# Altium footprint library Receiver_Library.PcbLib: 29 footprints (part 1 of 2)
Each footprint in its own frame and in the unit in brackets; x right, y up, seen from the top. Pads: shape width x height; smd on the part's side, far side on the other; paste and mask are expansions set on the pad; w line width, h text height; cw(c..) or ccw(c..) is an arc to the next point about the centre after c.
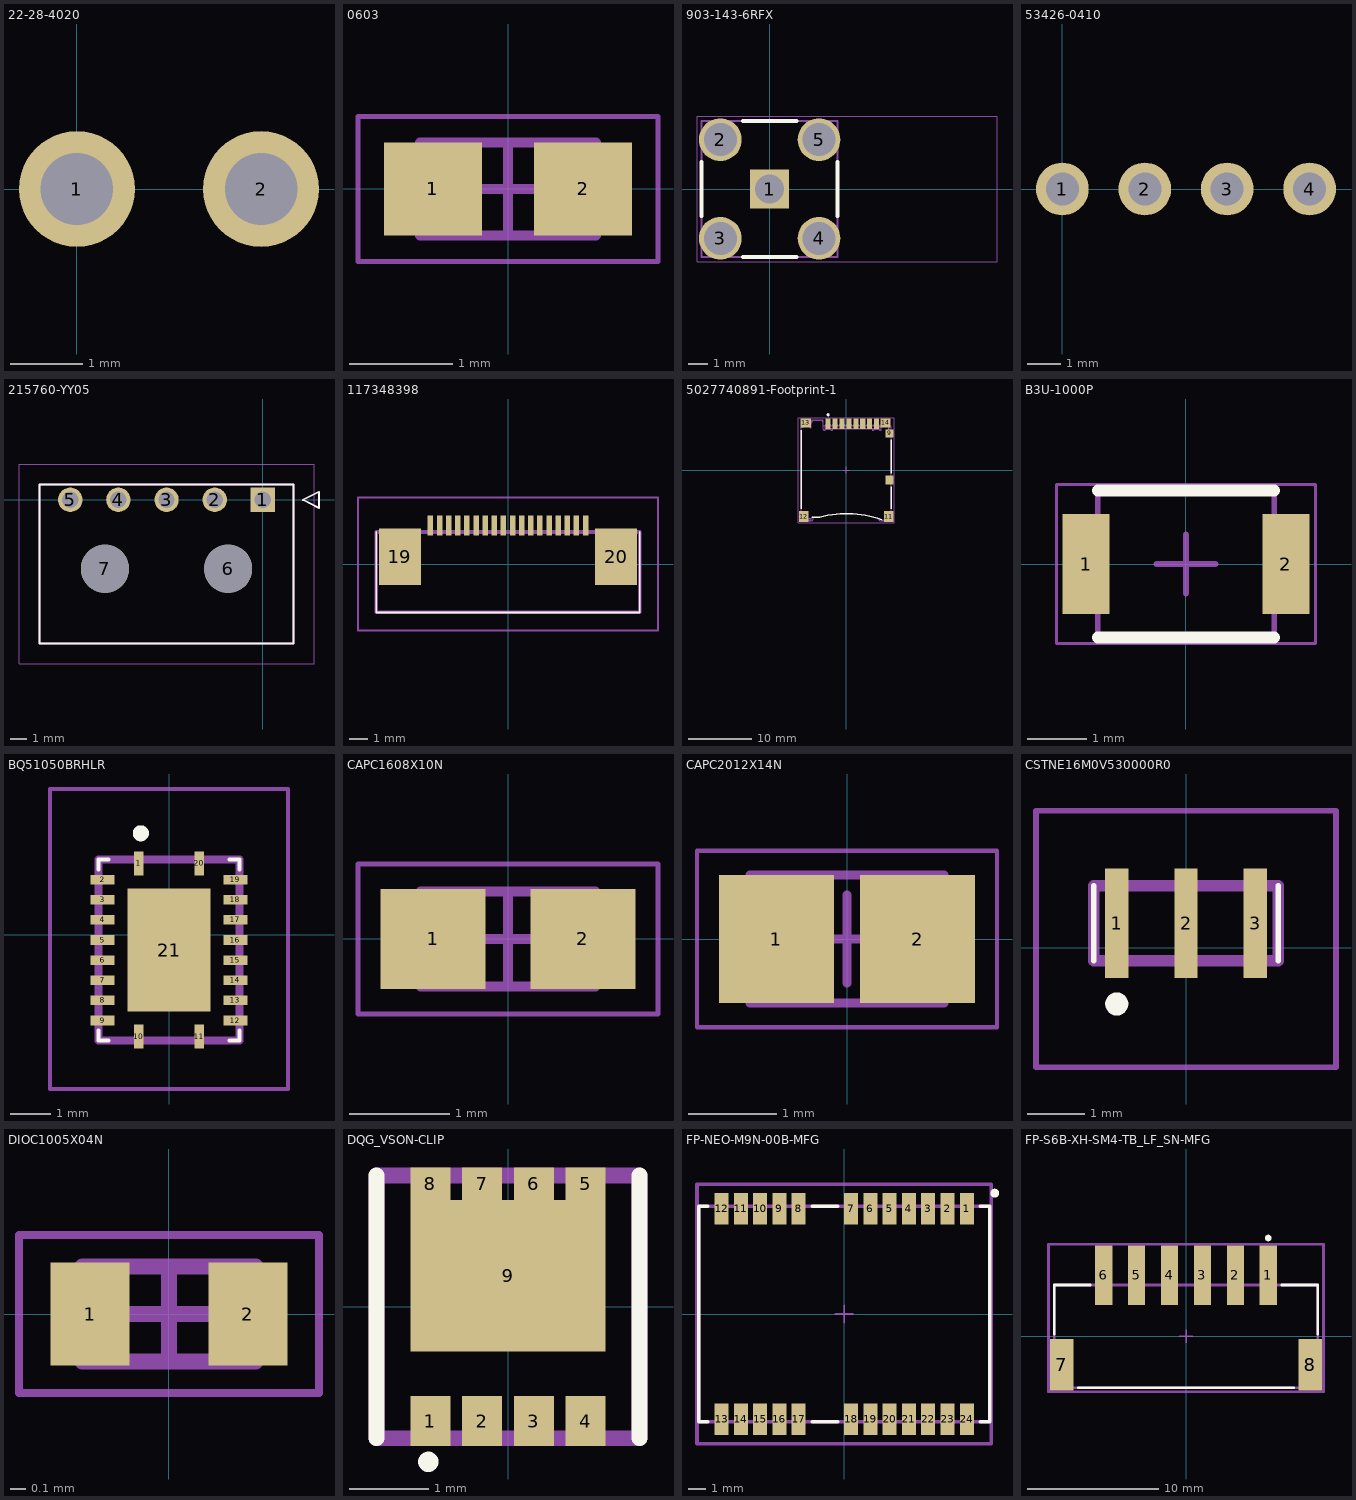
[diagram p0: the footprints below, top view; thin cyan lines are the x and y axes]

## 22-28-4020 [mm]
pads (2):
  round 1.6 hole 1: 1(0,0) 2(2.54,0)
3D body "BG030-02-A-0584-0305-N-G.stp": height 8.38, standoff -3.05, extent -1.27,-1.27 3.81,1.23

## 0603 [mm] "Generic 0603 Footprint"
height 0.6
pads (2):
  rect 0.95x0.9 smd: 1(-0.725,0) 2(0.725,0)
Top Courtyard:
  lines w0.05: -1.45,-0.7 -1.45,0.7 1.45,0.7 1.45,-0.7 -1.45,-0.7
  lines w0.1: -0.45,0 0.45,0 ; 0,-0.45 0,0.45
Top Assembly:
  lines w0.1: -0.85,-0.45 -0.85,0.45 0.85,0.45 0.85,-0.45 -0.85,-0.45
3D body: height 0.6, standoff 0, extent -0.55,-0.45 0.55,0.45
3D body: height 0.6, standoff 0, extent -0.85,-0.45 -0.55,0.45
3D body: height 0.6, standoff 0, extent 0.55,-0.45 0.85,0.45

## 903-143-6RFX [mm]
pads (5):
  rect 2x2 hole 1.5: 1(0,0)
  round 2.2 hole 1.7: 2(-2.54,2.54) 3(-2.54,-2.54) 4(2.54,-2.54) 5(2.54,2.54)
Top Overlay:
  lines w0.2: -3.5,-1.38 -3.5,1.38 ; -1.38,-3.5 1.38,-3.5 ; -1.38,3.5 1.38,3.5 ; 3.5,-1.38 3.5,1.38
Mechanical 13:
  lines w0.1: -3.5,-3.5 3.5,-3.5 3.5,3.5 -3.5,3.5 -3.5,-3.5
Mechanical 15:
  lines w0.05: -3.74,-3.74 11.7,-3.74 11.7,3.74 -3.74,3.74 -3.74,-3.74
3D body "901-143-6RFX.stp": height 10.5, standoff -3.3, extent -3.5,-3.5 3.5,11.6

## 53426-0410 [mm]
pads (4):
  round 1.6 hole 1: 1(0,0) 2(2.5,0) 3(5,0) 4(7.5,0)
3D body "534260410.STEP": height 6.7, standoff -3.4, extent -2.45,-9 9.95,2.5

## 215760-YY05 [mm]
pads (7):
  rect 1.52x1.52 hole 1.02: 1(0,0)
  round 1.52 hole 1.02: 2(-3,0) 3(-6,0) 4(-9,0) 5(-12,0)
  round 3 hole 3 unplated: 6(-2.16,-4.3) 7(-9.84,-4.3)
Top Overlay:
  lines w0.127: -13.925,-8.955 1.925,-8.955 1.925,0.955 -13.925,0.955 -13.925,-8.955 ; 2.5,0 3.5,-0.5 3.5,0.5 2.5,0
Mechanical 13:
  lines w0.127: -13.925,-8.955 1.925,-8.955 1.925,0.955 -13.925,0.955 -13.925,-8.955 ; 2.5,0 3.5,-0.5 3.5,0.5 2.5,0
Mechanical 15:
  lines w0.05: -15.195,-10.225 3.195,-10.225 3.195,2.225 -15.195,2.225 -15.195,-10.225
3D body "215760-2005.stp": height 5.33, standoff -3.79, extent -13.945,-8.925 1.905,0.985

## 117348398 [mm]
pads (20):
  rect 0.3x1.1 smd: 1(-4.25,2.1) 2(-3.75,2.1) 3(-3.25,2.1) 4(-2.75,2.1) 5(-2.25,2.1) 6(-1.75,2.1) 7(-1.25,2.1) 8(-0.75,2.1) 9(-0.25,2.1) 10(0.25,2.1) 11(0.75,2.1) 12(1.25,2.1) 13(1.75,2.1) 14(2.25,2.1) 15(2.75,2.1) 16(3.25,2.1) 17(3.75,2.1) 18(4.25,2.1)
  rect 2.3x3.1 smd: 19(-5.92,0.4) 20(5.92,0.4)
Top Overlay:
  lines w0.1: -7.215,1.75 -7.215,-2.65 7.215,-2.65 7.215,1.75
Mechanical 13:
  lines w0.2: -7.215,-2.65 -7.215,1.75 7.215,1.75 7.215,-2.65 -7.215,-2.65
Mechanical 15:
  lines w0.1: -8.215,-3.65 -8.215,3.65 8.215,3.65 8.215,-3.65 -8.215,-3.65
3D body "1-1734839-8.stp": height 2.05, standoff 0, extent -7.215,-2.56 7.215,2.55

## 5027740891-Footprint-1 [mm]
pads (14):
  rect 0.8x1.68 smd: 1(-2.9,7.385) 2(-1.8,7.385) 3(-0.7,7.385) 4(0.4,7.385) 5(1.5,7.385) 6(2.6,7.385) 7(3.7,7.385) 8(4.8,7.385)
  rect 1.29x1.3 smd: 9(6.855,5.825)
  rect 1.29x1.4 smd: 10(6.855,-1.575)
  rect 1.5x1.7 smd: 11(6.75,-7.375) 12(-6.75,-7.375)
  rect 1.7x1.5 smd: 13(-6.45,7.475)
  rect 1.6x1.5 smd: 14(6.21,7.475)
Top Overlay:
  circle w0.25: c-2.9,8.775 r0.125
  lines w0.2: -7.15,-6.125 -7.15,6.325 ; -5.41,-7.5 -4.227,-7.5 cw(c0.1,-22.801) 5.598,-7.881 ; 7.15,-6.125 7.15,-2.675 ; 7.15,-0.475 7.15,4.775
Mechanical 13:
  drawing of 232 lines, arcs and shapes, not listed
Mechanical 15:
  lines w0.05: -7.6,-8.325 7.6,-8.325 7.6,8.325 -7.6,8.325 -7.6,-8.325
  lines w0.1: -0.5,0 0.5,0 ; 0,-0.5 0,0.5
3D body "5027740891-colour.STEP": height 1.78, standoff -0.02, extent -7.15,-8 7.15,8

## B3U-1000P [mm]
pads (2):
  rect 0.8x1.7 smd: 1(-1.7,0) 2(1.7,0)
Top Overlay:
  lines w0.2: -1.5,-1.25 1.5,-1.25 ; -1.5,1.25 1.5,1.25
Mechanical 13:
  lines w0.1: -1.5,-1.25 1.5,-1.25 1.5,1.25 -1.5,1.25 -1.5,-1.25
Mechanical 15:
  lines w0.05: -2.2,-1.35 2.2,-1.35 2.2,1.35 -2.2,1.35 -2.2,-1.35
  lines w0.1: -0.5,0 0.5,0 ; 0,-0.5 0,0.5
3D body: height 1.75, standoff 1.35, extent -0.75,-0.75 0.75,0.75
3D body: height 1.35, standoff 0, extent -1.5,-1.25 1.5,1.25

## BQ51050BRHLR [mm]
pads (21):
  rect 0.24x0.6 smd: 1(-0.75,1.775) 10(-0.75,-2.525) 11(0.75,-2.525) 20(0.75,1.775)
  rect 0.6x0.24 smd: 2(-1.65,1.375) 3(-1.65,0.875) 4(-1.65,0.375) 5(-1.65,-0.125) 6(-1.65,-0.625) 7(-1.65,-1.125) 8(-1.65,-1.625) 9(-1.65,-2.125) 12(1.65,-2.125) 13(1.65,-1.625) 14(1.65,-1.125) 15(1.65,-0.625) 16(1.65,-0.125) 17(1.65,0.375) 18(1.65,0.875) 19(1.65,1.375)
  rect 2.05x3.05 smd: 21(0,-0.375)
Top Overlay:
  lines w0.1: -1.75,-2.375 -1.75,-2.625 -1.5,-2.625 ; -1.75,1.625 -1.75,1.875 -1.5,1.875 ; 1.5,-2.625 1.75,-2.625 1.75,-2.375 ; 1.5,1.875 1.75,1.875 1.75,1.625
  lines w0.2: -0.8,2.525 ccw(c-0.7,2.525) -0.6,2.525 ccw(c-0.7,2.525) -0.8,2.525
Mechanical 13:
  lines w0.2: -1.75,-2.625 -1.75,1.875 1.75,1.875 1.75,-2.625 -1.75,-2.625
Mechanical 15:
  lines w0.1: -2.95,-3.825 -2.95,3.625 2.95,3.625 2.95,-3.825 -2.95,-3.825
3D body "BQ24030RHLR.stp": height 1, standoff 0, extent -1.75,-2.64 1.75,1.86

## CAPC1608X10N [mm]
pads (2):
  rect 1.05x1 smd: 1(-0.75,0) 2(0.75,0)
Mechanical 13:
  lines w0.1: -0.875,-0.475 0.875,-0.475 0.875,0.475 -0.875,0.475 -0.875,-0.475
Mechanical 15:
  lines w0.05: -1.5,-0.75 1.5,-0.75 1.5,0.75 -1.5,0.75 -1.5,-0.75
  lines w0.1: -0.475,0 0.475,0 ; 0,-0.475 0,0.475
3D body "CAPC1608X10N.step": height 0.95, standoff 0, extent -0.875,-0.475 0.875,0.475

## CAPC2012X14N [mm]
pads (2):
  rect 1.3x1.45 smd: 1(-0.8,0) 2(0.8,0)
Mechanical 13:
  lines w0.1: -1.1,-0.725 1.1,-0.725 1.1,0.725 -1.1,0.725 -1.1,-0.725
Mechanical 15:
  lines w0.05: -1.7,-1 1.7,-1 1.7,1 -1.7,1 -1.7,-1
  lines w0.1: -0.5,0 0.5,0 ; 0,-0.5 0,0.5
3D body "CAPC2012X14N.step": height 1.45, standoff 0, extent -1.1,-0.725 1.1,0.725

## CSTNE16M0V530000R0 [mm]
pads (3):
  rect 0.4x1.9 smd: 1(-1.2,0.425) 2(0,0.425) 3(1.2,0.425)
Top Overlay:
  lines w0.1: -1.6,-0.225 -1.6,1.075 ; 1.6,-0.225 1.6,1.075
  lines w0.2: -1.3,-0.975 ccw(c-1.2,-0.975) -1.1,-0.975 ccw(c-1.2,-0.975) -1.3,-0.975
Mechanical 13:
  lines w0.2: -1.6,-0.225 -1.6,1.075 1.6,1.075 1.6,-0.225 -1.6,-0.225
Mechanical 15:
  lines w0.1: -2.6,-2.075 -2.6,2.375 2.6,2.375 2.6,-2.075 -2.6,-2.075
3D body "CSTNE16M0V530000R0.stp": height 0.9, standoff 0, extent -1.6,-0.19 1.6,1.11

## DIOC1005X04N [mm]
pads (2):
  rect 0.5x0.65 smd: 1(-0.5,0) 2(0.5,0)
Top Courtyard:
  lines w0.05: -0.95,-0.5 -0.95,0.5 0.95,0.5 0.95,-0.5 -0.95,-0.5
  lines w0.1: -0.3,0 0.3,0 ; 0,-0.3 0,0.3
Top Assembly:
  lines w0.1: -0.55,-0.3 -0.55,0.3 0.55,0.3 0.55,-0.3 -0.55,-0.3
3D body "DIOC1005X04N.step": height 0.44, standoff 0, extent -0.55,-0.3 0.55,0.3

## DQG_VSON-CLIP [mm]
pads (9):
  rect 0.5x0.63 smd: 1(-0.975,-1.435) 2(-0.325,-1.435) 3(0.325,-1.435) 4(0.975,-1.435)
  rect 0.5x0.41 smd: 5(0.975,1.545) 6(0.325,1.545) 7(-0.325,1.545) 8(-0.975,1.545)
  rect 2.45x1.9 smd: 9(0,0.39)
Top Overlay:
  circle w0.2: c-1.001,-1.946 r0.027
  lines w0.2: -1.65,-1.65 -1.65,1.65 ; 1.65,-1.65 1.65,1.65
Mechanical 13:
  lines w0.2: -1.65,-1.65 1.65,-1.65 1.65,1.65 -1.65,1.65 -1.65,-1.65
3D body "CSD16406Q3.stp": height 1.1, standoff 0, extent -1.65,-1.65 1.65,1.65

## FP-NEO-M9N-00B-MFG [mm]
pads (24):
  rect 0.8x1.8 smd paste-1000 mask-1000: 1(7,6) 2(5.9,6) 3(4.8,6) 4(3.7,6) 5(2.6,6) 6(1.5,6) 7(0.4,6) 8(-2.6,6) 9(-3.7,6) 10(-4.8,6) 11(-5.9,6) 12(-7,6) 13(-7,-6) 14(-5.9,-6) 15(-4.8,-6) 16(-3.7,-6) 17(-2.6,-6) 18(0.4,-6) 19(1.5,-6) 20(2.6,-6) 21(3.7,-6) 22(4.8,-6) 23(5.9,-6) 24(7,-6)
Top Overlay:
  circle w0.25: c8.6,6.9 r0.125
  lines w0.2: -7.775,-6.15 -8.3,-6.15 -8.3,6.15 -7.775,6.15 ; -1.825,-6.15 -0.375,-6.15 ; -1.825,6.15 -0.375,6.15 ; 7.775,-6.15 8.3,-6.15 8.3,6.15 7.775,6.15
Top Paste:
  drawing of 24 lines, arcs and shapes, not listed
Top Solder:
  rectangle: -7.4,5.1 -6.6,7.3
  rectangle: -6.3,5.1 -5.5,7.3
  rectangle: -5.2,5.1 -4.4,7.3
  rectangle: -4.1,5.1 -3.3,7.3
  rectangle: -3,5.1 -2.2,7.3
  rectangle: -7.4,-7.3 -6.6,-5.1
  rectangle: -6.3,-7.3 -5.5,-5.1
  rectangle: -5.2,-7.3 -4.4,-5.1
  rectangle: -4.1,-7.3 -3.3,-5.1
  rectangle: -3,-7.3 -2.2,-5.1
  rectangle: 6.6,-7.3 7.4,-5.1
  rectangle: 5.5,-7.3 6.3,-5.1
  rectangle: 4.4,-7.3 5.2,-5.1
  rectangle: 3.3,-7.3 4.1,-5.1
  rectangle: 2.2,-7.3 3,-5.1
  rectangle: 1.1,-7.3 1.9,-5.1
  rectangle: 0,-7.3 0.8,-5.1
  rectangle: 6.6,5.1 7.4,7.3
  rectangle: 5.5,5.1 6.3,7.3
  rectangle: 4.4,5.1 5.2,7.3
  rectangle: 3.3,5.1 4.1,7.3
  rectangle: 2.2,5.1 3,7.3
  rectangle: 1.1,5.1 1.9,7.3
  rectangle: 0,5.1 0.8,7.3
Top 3D Body:
  lines w0.2: -8.3,-6.15 8.3,-6.15 8.3,6.15 -8.3,6.15 -8.3,-6.15
Top Courtyard:
  lines w0.2: -8.4,-7.4 8.4,-7.4 8.4,7.4 -8.4,7.4 -8.4,-7.4
Top Assembly:
  lines w0.2: -8.4,-7.4 8.4,-7.4 8.4,7.4 -8.4,7.4 -8.4,-7.4
  text ".Designator" at 0,0 h1
Top Component Center:
  lines w0.1: -0.5,0 0.5,0 ; 0,-0.5 0,0.5
3D body "UNK_u-blox_NEO-M9N-00B_eec.STEP": height 0.25, standoff 0, extent -8.4,-7.4 8.4,7.4

## FP-S6B-XH-SM4-TB_LF_SN-MFG [mm]
pads (8):
  rect 1.3x4.5 smd paste+0 mask+0: 1(6.25,4.65) 2(3.75,4.65) 3(1.25,4.65) 4(-1.25,4.65) 5(-3.75,4.65) 6(-6.25,4.65)
  rect 1.8x3.9 smd paste+0 mask+0: 7(-9.45,-2.15) 8(9.45,-2.15)
Top Overlay:
  circle w0.25: c6.25,7.475 r0.125
  lines w0.2: -10,0.175 -10,3.9 -7.275,3.9 ; -8.175,-3.9 8.175,-3.9 ; 7.275,3.9 10,3.9 10,0.175
Top 3D Body:
  lines w0.2: -10,-3.9 -10,3.9 10,3.9 10,-3.9 -10,-3.9
Top Courtyard:
  lines w0.2: -10.45,-4.2 -10.45,7 10.45,7 10.45,-4.2 -10.45,-4.2
Top Assembly:
  lines w0.2: -10.45,-4.2 -10.45,7 10.45,7 10.45,-4.2 -10.45,-4.2
  text ".Designator" at 0,1.589 h1
Top Component Center:
  lines w0.1: -0.5,0 0.5,0 ; 0,-0.5 0,0.5
3D body "Conn_JST_S6B-XH-SM4-TB_LF_SN_eec.STEP": height 0.25, standoff 0, extent -10.45,-4.2 10.45,7